# Altium footprint library Power_Lib_Altium.PcbLib: 383 footprints (part 13 of 24)
Each footprint in its own frame and in the unit in brackets; x right, y up, seen from the top. Pads: shape width x height; smd on the part's side, far side on the other; paste and mask are expansions set on the pad; w line width, h text height; cw(c..) or ccw(c..) is an arc to the next point about the centre after c.
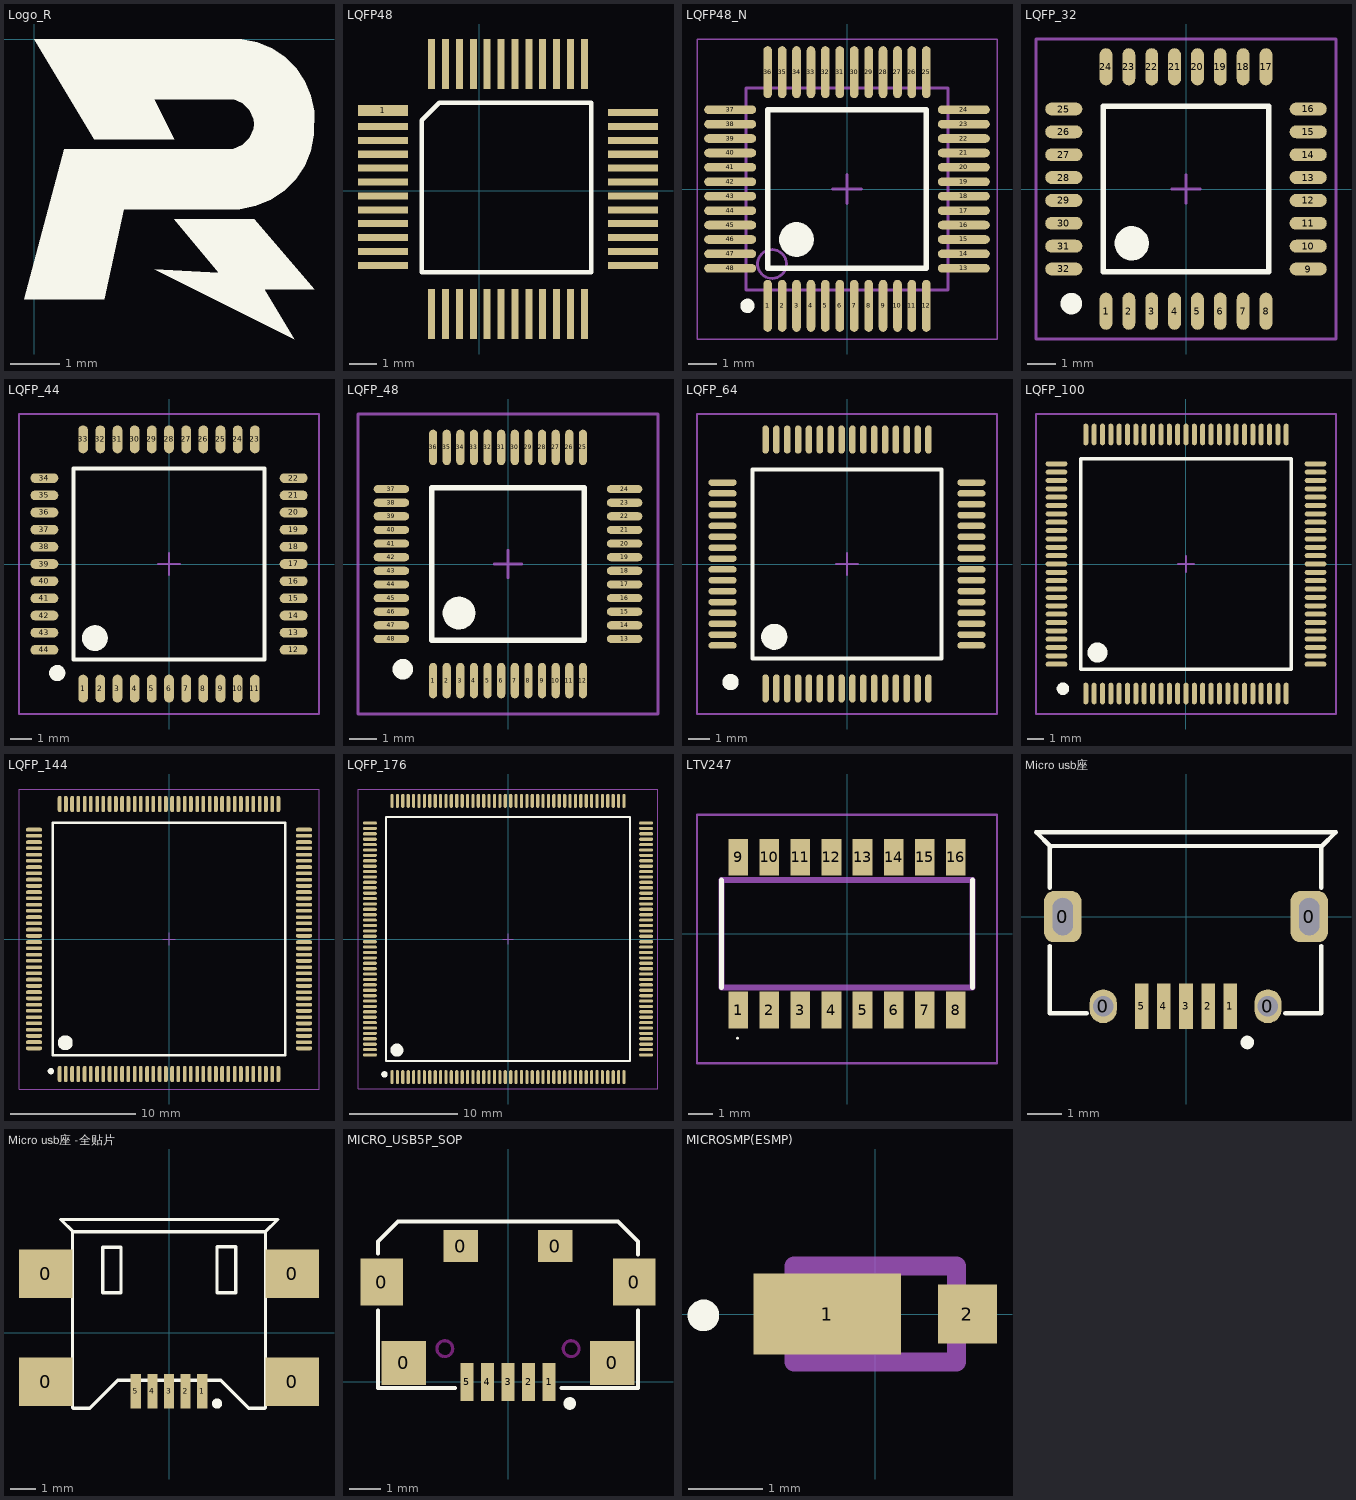
[diagram p12: the footprints below, top view; thin cyan lines are the x and y axes]

## Logo_R [mm]
Top Overlay:
  region: 5.69,-5.08 4.674,-5.08 5.283,-6.096 2.438,-4.674 3.75,-4.75 2.845,-3.658 4.47,-3.658
  region: 4.538,-0.062 4.834,-0.185 5.1,-0.363 5.327,-0.589 5.505,-0.856 5.627,-1.151 5.69,-1.465 5.69,-1.626 5.69,-1.778 5.69,-1.943 5.625,-2.267 5.499,-2.572 5.315,-2.847 5.082,-3.08 4.807,-3.264 4.502,-3.39 4.178,-3.454 4.013,-3.454 1.829,-3.454 1.422,-5.283 -0.203,-5.283 0.61,-2.235 3.962,-2.235 4.061,-2.225 4.245,-2.15 4.385,-2.009 4.461,-1.826 4.47,-1.727 4.461,-1.628 4.385,-1.445 4.245,-1.305 4.062,-1.229 3.962,-1.219 2.438,-1.219 2.845,-2.032 1.219,-2.032 0,0 4.224,0

## Logo_W [mm]

## LQFP48 [mil]
pads (48):
  rect 70.87x15 smd: 1(-136.5,113.7)
  rect 70.87x10 smd: 2(-136.5,91.02) 3(-136.5,71.33) 4(-136.5,51.65) 5(-136.5,31.96) 6(-136.5,12.28) 7(-136.5,-7.41) 8(-136.5,-27.09) 9(-136.5,-46.78) 10(-136.5,-66.47) 11(-136.5,-86.15) 12(-136.5,-105.83) 25(217.83,-105.83) 26(217.83,-86.15) 27(217.83,-66.47) 28(217.83,-46.78) 29(217.83,-27.09) 30(217.83,-7.41) 31(217.83,12.28) 32(217.83,31.96) 33(217.83,51.65) 34(217.83,71.33) 35(217.83,91.02) 36(217.83,110.7)
  rect 10x70.87 smd: 13(-67.6,-174.73) 14(-47.92,-174.73) 15(-28.23,-174.73) 16(-8.55,-174.73) 17(11.14,-174.73) 18(30.82,-174.73) 19(50.51,-174.73) 20(70.19,-174.73) 21(89.88,-174.73) 22(109.56,-174.73) 23(129.25,-174.73) 24(148.93,-174.73) 37(148.93,179.6) 38(129.25,179.6) 39(109.56,179.6) 40(89.88,179.6) 41(70.19,179.6) 42(50.51,179.6) 43(30.82,179.6) 44(11.14,179.6) 45(-8.55,179.6) 46(-28.23,179.6) 47(-47.92,179.6) 48(-67.6,179.6)
Top Overlay:
  lines w6.5: -81.51,99.69 -81.38,-115.68 158.78,-115.68 158.78,124.48 -56.72,124.48 -81.51,99.69
3D body "User Library-LQFP48_Grid_0.5_LQFP_PIN_2.sldprt": height 38.39, standoff 0.03, extent 176.47,-111 235.53,-100.37
3D body "User Library-LQFP48_Grid_0.5_LQFP_PIN_2.sldprt": height 38.39, standoff 0.03, extent 176.47,-91 235.53,-80.37
3D body "User Library-LQFP48_Grid_0.5_LQFP_PIN_2.sldprt": height 38.39, standoff 0.03, extent 176.47,-71.63 235.53,-61
3D body "User Library-LQFP48_Grid_0.5_LQFP_PIN_2.sldprt": height 38.39, standoff 0.03, extent 176.47,-52 235.53,-41.37
3D body "User Library-LQFP48_Grid_0.5_LQFP_PIN_2.sldprt": height 38.39, standoff 0.03, extent 176.47,-32 235.53,-21.37
3D body "User Library-LQFP48_Grid_0.5_LQFP_PIN_2.sldprt": height 38.39, standoff 0.03, extent 176.47,-12.63 235.53,-2
3D body "User Library-LQFP48_Grid_0.5_LQFP_PIN_2.sldprt": height 38.39, standoff 0.03, extent 176.47,7 235.53,17.63
3D body "User Library-LQFP48_Grid_0.5_LQFP_PIN_2.sldprt": height 38.39, standoff 0.03, extent 176.47,27 235.53,37.63
3D body "User Library-LQFP48_Grid_0.5_LQFP_PIN_2.sldprt": height 38.39, standoff 0.03, extent 176.47,46.37 235.53,57
3D body "User Library-LQFP48_Grid_0.5_LQFP_PIN_2.sldprt": height 38.39, standoff 0.03, extent 176.47,66.37 235.53,77
3D body "User Library-LQFP48_Grid_0.5_LQFP_PIN_2.sldprt": height 38.39, standoff 0.03, extent 177,85.68 236.06,96.32
3D body "User Library-LQFP48_Grid_0.5_LQFP_PIN_2.sldprt": height 38.39, standoff 0.03, extent 176.47,106 235.53,116.63
3D body "User Library-LQFP48_Grid_0.5_LQFP_PIN_2.sldprt": height 38.39, standoff 0.03, extent 144,137.47 154.63,196.53
3D body "User Library-LQFP48_Grid_0.5_LQFP_PIN_2.sldprt": height 38.39, standoff 0.03, extent 124,137.47 134.63,196.53
3D body "User Library-LQFP48_Grid_0.5_LQFP_PIN_2.sldprt": height 38.39, standoff 0.03, extent 104,137.47 114.63,196.53
3D body "User Library-LQFP48_Grid_0.5_LQFP_PIN_2.sldprt": height 38.39, standoff 0.03, extent 84,137.47 94.63,196.53
3D body "User Library-LQFP48_Grid_0.5_LQFP_PIN_2.sldprt": height 38.39, standoff 0.03, extent 65.37,137.47 76,196.53
3D body "User Library-LQFP48_Grid_0.5_LQFP_PIN_2.sldprt": height 38.39, standoff 0.03, extent 45,137.47 55.63,196.53
3D body "User Library-LQFP48_Grid_0.5_LQFP_PIN_2.sldprt": height 38.39, standoff 0.03, extent 26,137.47 36.63,196.53
3D body "User Library-LQFP48_Grid_0.5_LQFP_PIN_2.sldprt": height 38.39, standoff 0.03, extent 6,137.47 16.63,196.53
3D body "User Library-LQFP48_Grid_0.5_LQFP_PIN_2.sldprt": height 38.39, standoff 0.03, extent -13.63,137.47 -3,196.53
3D body "User Library-LQFP48_Grid_0.5_LQFP_PIN_2.sldprt": height 38.39, standoff 0.03, extent -34,137.47 -23.37,196.53
3D body "User Library-LQFP48_Grid_0.5_LQFP_PIN_2.sldprt": height 38.39, standoff 0.03, extent -53.63,137.47 -43,196.53
3D body "User Library-LQFP48_Grid_0.5_LQFP_PIN_2.sldprt": height 38.39, standoff 0.03, extent -73,137.47 -62.37,196.53
3D body "User Library-LQFP48_Grid_0.5_LQFP48_Koerper_2.sldprt": height 62.99, standoff 5.91, extent -95.8,-135.59 179.8,140
3D body "User Library-LQFP48_Grid_0.5_LQFP_PIN_2.sldprt": height 38.39, standoff 0.03, extent -152.53,108.37 -93.47,119
3D body "User Library-LQFP48_Grid_0.5_LQFP_PIN_2.sldprt": height 38.39, standoff 0.03, extent -152.53,85.37 -93.47,96
3D body "User Library-LQFP48_Grid_0.5_LQFP_PIN_2.sldprt": height 38.39, standoff 0.03, extent -152.53,66 -93.47,76.63
3D body "User Library-LQFP48_Grid_0.5_LQFP_PIN_2.sldprt": height 38.39, standoff 0.03, extent -152.53,46.37 -93.47,57
3D body "User Library-LQFP48_Grid_0.5_LQFP_PIN_2.sldprt": height 38.39, standoff 0.03, extent -152.53,26.37 -93.47,37
3D body "User Library-LQFP48_Grid_0.5_LQFP_PIN_2.sldprt": height 38.39, standoff 0.03, extent -152.53,7.11 -93.47,17.74
3D body "User Library-LQFP48_Grid_0.5_LQFP_PIN_2.sldprt": height 38.39, standoff 0.03, extent -152.53,-12.63 -93.47,-2
3D body "User Library-LQFP48_Grid_0.5_LQFP_PIN_2.sldprt": height 38.39, standoff 0.03, extent -152.53,-32.63 -93.47,-22
3D body "User Library-LQFP48_Grid_0.5_LQFP_PIN_2.sldprt": height 38.39, standoff 0.03, extent -152.53,-52.63 -93.47,-42
3D body "User Library-LQFP48_Grid_0.5_LQFP_PIN_2.sldprt": height 38.39, standoff 0.03, extent -152.53,-71.63 -93.47,-61
3D body "User Library-LQFP48_Grid_0.5_LQFP_PIN_2.sldprt": height 38.39, standoff 0.03, extent -152.53,-91.63 -93.47,-81
3D body "User Library-LQFP48_Grid_0.5_LQFP_PIN_2.sldprt": height 38.39, standoff 0.03, extent -153,-111.32 -93.94,-100.68
3D body "User Library-LQFP48_Grid_0.5_LQFP_PIN_2.sldprt": height 38.39, standoff 0.03, extent -73,-192.53 -62.37,-133.47
3D body "User Library-LQFP48_Grid_0.5_LQFP_PIN_2.sldprt": height 38.39, standoff 0.03, extent -53,-192.53 -42.37,-133.47
3D body "User Library-LQFP48_Grid_0.5_LQFP_PIN_2.sldprt": height 38.39, standoff 0.03, extent -33,-192.53 -22.37,-133.47
3D body "User Library-LQFP48_Grid_0.5_LQFP_PIN_2.sldprt": height 38.39, standoff 0.03, extent -14,-192.53 -3.37,-133.47
3D body "User Library-LQFP48_Grid_0.5_LQFP_PIN_2.sldprt": height 38.39, standoff 0.03, extent 6,-192.53 16.63,-133.47
3D body "User Library-LQFP48_Grid_0.5_LQFP_PIN_2.sldprt": height 38.39, standoff 0.03, extent 26,-192.53 36.63,-133.47
3D body "User Library-LQFP48_Grid_0.5_LQFP_PIN_2.sldprt": height 38.39, standoff 0.03, extent 45,-192.53 55.63,-133.47
3D body "User Library-LQFP48_Grid_0.5_LQFP_PIN_2.sldprt": height 38.39, standoff 0.03, extent 65,-192.53 75.63,-133.47
3D body "User Library-LQFP48_Grid_0.5_LQFP_PIN_2.sldprt": height 38.39, standoff 0.03, extent 85,-192.53 95.63,-133.47
3D body "User Library-LQFP48_Grid_0.5_LQFP_PIN_2.sldprt": height 38.39, standoff 0.03, extent 104,-192.53 114.63,-133.47
3D body "User Library-LQFP48_Grid_0.5_LQFP_PIN_2.sldprt": height 38.39, standoff 0.03, extent 124,-192.53 134.63,-133.47
3D body "User Library-LQFP48_Grid_0.5_LQFP_PIN_2.sldprt": height 38.39, standoff 0.03, extent 144,-192.53 154.63,-133.47

## LQFP48_N [mm] "QFP, 48-Leads, Body 7x7mm, Pitch 0.5mm, IPC Medium Density"
height 1.6
pads (48):
  oval 0.3x1.8 smd: 1(-2.75,-4.05) 2(-2.25,-4.05) 3(-1.75,-4.05) 4(-1.25,-4.05) 5(-0.75,-4.05) 6(-0.25,-4.05) 7(0.25,-4.05) 8(0.75,-4.05) 9(1.25,-4.05) 10(1.75,-4.05) 11(2.25,-4.05) 12(2.75,-4.05) 25(2.75,4.05) 26(2.25,4.05) 27(1.75,4.05) 28(1.25,4.05) 29(0.75,4.05) 30(0.25,4.05) 31(-0.25,4.05) 32(-0.75,4.05) 33(-1.25,4.05) 34(-1.75,4.05) 35(-2.25,4.05) 36(-2.75,4.05)
  oval 1.8x0.3 smd: 13(4.05,-2.75) 14(4.05,-2.25) 15(4.05,-1.75) 16(4.05,-1.25) 17(4.05,-0.75) 18(4.05,-0.25) 19(4.05,0.25) 20(4.05,0.75) 21(4.05,1.25) 22(4.05,1.75) 23(4.05,2.25) 24(4.05,2.75) 37(-4.05,2.75) 38(-4.05,2.25) 39(-4.05,1.75) 40(-4.05,1.25) 41(-4.05,0.75) 42(-4.05,0.25) 43(-4.05,-0.25) 44(-4.05,-0.75) 45(-4.05,-1.25) 46(-4.05,-1.75) 47(-4.05,-2.25) 48(-4.05,-2.75)
Top Overlay:
  circle w0.25: c-3.45,-4.05 r0.125
  circle w0.6: c-1.75,-1.75 r0.3
  lines w0.2: -2.75,-2.75 2.75,-2.75 2.75,2.75 -2.75,2.75 -2.75,-2.75
Mechanical 13:
  circle w0.1: c-2.6,-2.6 r0.5
  lines w0.1: -3.5,-3.5 3.5,-3.5 3.5,3.5 -3.5,3.5 -3.5,-3.5
Mechanical 15:
  lines w0.05: -5.2,-5.2 5.2,-5.2 5.2,5.2 -5.2,5.2 -5.2,-5.2
  lines w0.1: -0.5,0 0.5,0 ; 0,-0.5 0,0.5
3D body: height 1.6, standoff 0.05, extent -3.5,-3.5 3.5,3.5

## LQFP_32 [mm]
height 1.2
pads (32):
  oval 0.45x1.3 smd: 1(-2.8,-4.277) 2(-2,-4.277) 3(-1.2,-4.277) 4(-0.4,-4.277) 5(0.4,-4.277) 6(1.2,-4.277) 7(2,-4.277) 8(2.8,-4.277) 17(2.8,4.277) 18(2,4.277) 19(1.2,4.277) 20(0.4,4.277) 21(-0.4,4.277) 22(-1.2,4.277) 23(-2,4.277) 24(-2.8,4.277)
  oval 1.3x0.45 smd: 9(4.277,-2.8) 10(4.277,-2) 11(4.277,-1.2) 12(4.277,-0.4) 13(4.277,0.4) 14(4.277,1.2) 15(4.277,2) 16(4.277,2.8) 25(-4.277,2.8) 26(-4.277,2) 27(-4.277,1.2) 28(-4.277,0.4) 29(-4.277,-0.4) 30(-4.277,-1.2) 31(-4.277,-2) 32(-4.277,-2.8)
Top Overlay:
  circle w0.6: c-1.9,-1.9 r0.3
  circle w0.5: c-4.013,-4.011 r0.125
  lines w0.2: -2.9,-2.9 -2.9,2.9 2.9,2.9 2.9,-2.9 -2.9,-2.9
Mechanical 15:
  lines w0.1: -0.5,0 0.5,0 ; 0,-0.5 0,0.5 ; -5.25,-5.25 -5.25,5.25 5.25,5.25 5.25,-5.25 -5.25,-5.25
3D body "LQFP_32.STEP": height 1.48, standoff -0.01, extent -4.552,-4.503 4.553,4.503

## LQFP_44 [mm]
height 1.6
pads (44):
  oval 0.45x1.3 smd: 1(-4,-5.804) 2(-3.2,-5.804) 3(-2.4,-5.804) 4(-1.6,-5.804) 5(-0.8,-5.804) 6(0,-5.804) 7(0.8,-5.804) 8(1.6,-5.804) 9(2.4,-5.804) 10(3.2,-5.804) 11(4,-5.804) 23(4,5.804) 24(3.2,5.804) 25(2.4,5.804) 26(1.6,5.804) 27(0.8,5.804) 28(0,5.804) 29(-0.8,5.804) 30(-1.6,5.804) 31(-2.4,5.804) 32(-3.2,5.804) 33(-4,5.804)
  oval 1.3x0.45 smd: 12(5.804,-4) 13(5.804,-3.2) 14(5.804,-2.4) 15(5.804,-1.6) 16(5.804,-0.8) 17(5.804,0) 18(5.804,0.8) 19(5.804,1.6) 20(5.804,2.4) 21(5.804,3.2) 22(5.804,4) 34(-5.804,4) 35(-5.804,3.2) 36(-5.804,2.4) 37(-5.804,1.6) 38(-5.804,0.8) 39(-5.804,0) 40(-5.804,-0.8) 41(-5.804,-1.6) 42(-5.804,-2.4) 43(-5.804,-3.2) 44(-5.804,-4)
Top Overlay:
  circle w0.5: c-5.205,-5.08 r0.125
  circle w0.6: c-3.45,-3.45 r0.3
  lines w0.2: -4.45,-4.45 4.45,-4.45 4.45,4.45 -4.45,4.45 -4.45,-4.45
Mechanical 15:
  lines w0.1: -0.5,0 0.5,0 ; 0,-0.5 0,0.5 ; -6.985,-6.985 6.985,-6.985 6.985,6.985 -6.985,6.985 -6.985,-6.985
3D body "LQFP_44.STEP": height 1.68, standoff -0.01, extent -5.999,-5.999 5.999,5.999

## LQFP_48 [mm]
height 1.6
pads (48):
  oval 0.3x1.3 smd: 1(-2.75,-4.28) 2(-2.25,-4.28) 3(-1.75,-4.28) 4(-1.25,-4.28) 5(-0.75,-4.28) 6(-0.25,-4.28) 7(0.25,-4.28) 8(0.75,-4.28) 9(1.25,-4.28) 10(1.75,-4.28) 11(2.25,-4.28) 12(2.75,-4.28) 25(2.75,4.28) 26(2.25,4.28) 27(1.75,4.28) 28(1.25,4.28) 29(0.75,4.28) 30(0.25,4.28) 31(-0.25,4.28) 32(-0.75,4.28) 33(-1.25,4.28) 34(-1.75,4.28) 35(-2.25,4.28) 36(-2.75,4.28)
  oval 1.3x0.3 smd: 13(4.28,-2.75) 14(4.28,-2.25) 15(4.28,-1.75) 16(4.28,-1.25) 17(4.28,-0.75) 18(4.28,-0.25) 19(4.28,0.25) 20(4.28,0.75) 21(4.28,1.25) 22(4.28,1.75) 23(4.28,2.25) 24(4.28,2.75) 37(-4.28,2.75) 38(-4.28,2.25) 39(-4.28,1.75) 40(-4.28,1.25) 41(-4.28,0.75) 42(-4.28,0.25) 43(-4.28,-0.25) 44(-4.28,-0.75) 45(-4.28,-1.25) 46(-4.28,-1.75) 47(-4.28,-2.25) 48(-4.28,-2.75)
Top Overlay:
  circle w0.6: c-1.8,-1.8 r0.3
  circle w0.5: c-3.859,-3.861 r0.125
  lines w0.2: -2.8,-2.8 -2.8,2.8 2.8,2.8 2.8,-2.8 -2.8,-2.8
Mechanical 15:
  lines w0.1: -0.5,0 0.5,0 ; 0,-0.5 0,0.5 ; -5.505,-5.505 -5.505,5.505 5.505,5.505 5.505,-5.505 -5.505,-5.505
3D body "LQFP_48.STEP": height 1.52, standoff -0.01, extent -4.499,-4.499 4.499,4.499

## LQFP_64 [mm]
height 1.6
pads (64):
  oval 0.3x1.3 smd: 1(-3.75,-5.729) 2(-3.25,-5.729) 3(-2.75,-5.729) 4(-2.25,-5.729) 5(-1.75,-5.729) 6(-1.25,-5.729) 7(-0.75,-5.729) 8(-0.25,-5.729) 9(0.25,-5.729) 10(0.75,-5.729) 11(1.25,-5.729) 12(1.75,-5.729) 13(2.25,-5.729) 14(2.75,-5.729) 15(3.25,-5.729) 16(3.75,-5.729) 33(3.75,5.729) 34(3.25,5.729) 35(2.75,5.729) 36(2.25,5.729) 37(1.75,5.729) 38(1.25,5.729) 39(0.75,5.729) 40(0.25,5.729) 41(-0.25,5.729) 42(-0.75,5.729) 43(-1.25,5.729) 44(-1.75,5.729) 45(-2.25,5.729) 46(-2.75,5.729) 47(-3.25,5.729) 48(-3.75,5.729)
  oval 1.3x0.3 smd: 17(5.729,-3.75) 18(5.729,-3.25) 19(5.729,-2.75) 20(5.729,-2.25) 21(5.729,-1.75) 22(5.729,-1.25) 23(5.729,-0.75) 24(5.729,-0.25) 25(5.729,0.25) 26(5.729,0.75) 27(5.729,1.25) 28(5.729,1.75) 29(5.729,2.25) 30(5.729,2.75) 31(5.729,3.25) 32(5.729,3.75) 49(-5.729,3.75) 50(-5.729,3.25) 51(-5.729,2.75) 52(-5.729,2.25) 53(-5.729,1.75) 54(-5.729,1.25) 55(-5.729,0.75) 56(-5.729,0.25) 57(-5.729,-0.25) 58(-5.729,-0.75) 59(-5.729,-1.25) 60(-5.729,-1.75) 61(-5.729,-2.25) 62(-5.729,-2.75) 63(-5.729,-3.25) 64(-5.729,-3.75)
Top Overlay:
  circle w0.6: c-3.35,-3.35 r0.3
  circle w0.5: c-5.357,-5.436 r0.125
  lines w0.2: -4.35,-4.35 -4.35,4.35 4.35,4.35 4.35,-4.35 -4.35,-4.35
Mechanical 15:
  lines w0.1: -0.5,0 0.5,0 ; 0,-0.5 0,0.5 ; -6.904,-6.904 -6.904,6.904 6.904,6.904 6.904,-6.904 -6.904,-6.904
3D body "LQFP_64.STEP": height 1.78, standoff -0.01, extent -5.999,-5.999 5.999,5.999

## LQFP_100 [mm]
height 1.6
pads (100):
  oval 0.3x1.3 smd: 1(-6,-7.754) 2(-5.5,-7.754) 3(-5,-7.754) 4(-4.5,-7.754) 5(-4,-7.754) 6(-3.5,-7.754) 7(-3,-7.754) 8(-2.5,-7.754) 9(-2,-7.754) 10(-1.5,-7.754) 11(-1,-7.754) 12(-0.5,-7.754) 13(0,-7.754) 14(0.5,-7.754) 15(1,-7.754) 16(1.5,-7.754) 17(2,-7.754) 18(2.5,-7.754) 19(3,-7.754) 20(3.5,-7.754) 21(4,-7.754) 22(4.5,-7.754) 23(5,-7.754) 24(5.5,-7.754) 25(6,-7.754) 51(6,7.754) 52(5.5,7.754) 53(5,7.754) 54(4.5,7.754) 55(4,7.754) 56(3.5,7.754) 57(3,7.754) 58(2.5,7.754) 59(2,7.754) 60(1.5,7.754) 61(1,7.754) 62(0.5,7.754) 63(0,7.754) 64(-0.5,7.754) 65(-1,7.754) 66(-1.5,7.754) 67(-2,7.754) 68(-2.5,7.754) 69(-3,7.754) 70(-3.5,7.754) 71(-4,7.754) 72(-4.5,7.754) 73(-5,7.754) 74(-5.5,7.754) 75(-6,7.754)
  oval 1.3x0.3 smd: 26(7.754,-6) 27(7.754,-5.5) 28(7.754,-5) 29(7.754,-4.5) 30(7.754,-4) 31(7.754,-3.5) 32(7.754,-3) 33(7.754,-2.5) 34(7.754,-2) 35(7.754,-1.5) 36(7.754,-1) 37(7.754,-0.5) 38(7.754,0) 39(7.754,0.5) 40(7.754,1) 41(7.754,1.5) 42(7.754,2) 43(7.754,2.5) 44(7.754,3) 45(7.754,3.5) 46(7.754,4) 47(7.754,4.5) 48(7.754,5) 49(7.754,5.5) 50(7.754,6) 76(-7.754,6) 77(-7.754,5.5) 78(-7.754,5) 79(-7.754,4.5) 80(-7.754,4) 81(-7.754,3.5) 82(-7.754,3) 83(-7.754,2.5) 84(-7.754,2) 85(-7.754,1.5) 86(-7.754,1) 87(-7.754,0.5) 88(-7.754,0) 89(-7.754,-0.5) 90(-7.754,-1) 91(-7.754,-1.5) 92(-7.754,-2) 93(-7.754,-2.5) 94(-7.754,-3) 95(-7.754,-3.5) 96(-7.754,-4) 97(-7.754,-4.5) 98(-7.754,-5) 99(-7.754,-5.5) 100(-7.754,-6)
Top Overlay:
  circle w0.6: c-5.3,-5.3 r0.3
  circle w0.5: c-7.364,-7.468 r0.125
  lines w0.2: -6.3,-6.3 -6.3,6.3 6.3,6.3 6.3,-6.3 -6.3,-6.3
Mechanical 15:
  lines w0.1: -0.5,0 0.5,0 ; 0,-0.5 0,0.5 ; -8.979,-8.979 -8.979,8.979 8.979,8.979 8.979,-8.979 -8.979,-8.979
3D body "LQFP_100.STEP": height 1.72, standoff -0.03, extent -7.998,-7.999 7.999,7.999

## LQFP_144 [mm]
height 1.6
pads (144):
  oval 0.3x1.3 smd: 1(-8.75,-10.8) 2(-8.25,-10.8) 3(-7.75,-10.8) 4(-7.25,-10.8) 5(-6.75,-10.8) 6(-6.25,-10.8) 7(-5.75,-10.8) 8(-5.25,-10.8) 9(-4.75,-10.8) 10(-4.25,-10.8) 11(-3.75,-10.8) 12(-3.25,-10.8) 13(-2.75,-10.8) 14(-2.25,-10.8) 15(-1.75,-10.8) 16(-1.25,-10.8) 17(-0.75,-10.8) 18(-0.25,-10.8) 19(0.25,-10.8) 20(0.75,-10.8) 21(1.25,-10.8) 22(1.75,-10.8) 23(2.25,-10.8) 24(2.75,-10.8) 25(3.25,-10.8) 26(3.75,-10.8) 27(4.25,-10.8) 28(4.75,-10.8) 29(5.25,-10.8) 30(5.75,-10.8) 31(6.25,-10.8) 32(6.75,-10.8) 33(7.25,-10.8) 34(7.75,-10.8) 35(8.25,-10.8) 36(8.75,-10.8) 73(8.75,10.8) 74(8.25,10.8) 75(7.75,10.8) 76(7.25,10.8) 77(6.75,10.8) 78(6.25,10.8) 79(5.75,10.8) 80(5.25,10.8) 81(4.75,10.8) 82(4.25,10.8) 83(3.75,10.8) 84(3.25,10.8) 85(2.75,10.8) 86(2.25,10.8) 87(1.75,10.8) 88(1.25,10.8) 89(0.75,10.8) 90(0.25,10.8) 91(-0.25,10.8) 92(-0.75,10.8) 93(-1.25,10.8) 94(-1.75,10.8) 95(-2.25,10.8) 96(-2.75,10.8) 97(-3.25,10.8) 98(-3.75,10.8) 99(-4.25,10.8) 100(-4.75,10.8) 101(-5.25,10.8) 102(-5.75,10.8) 103(-6.25,10.8) 104(-6.75,10.8) 105(-7.25,10.8) 106(-7.75,10.8) 107(-8.25,10.8) 108(-8.75,10.8)
  oval 1.3x0.3 smd: 37(10.8,-8.75) 38(10.8,-8.25) 39(10.8,-7.75) 40(10.8,-7.25) 41(10.8,-6.75) 42(10.8,-6.25) 43(10.8,-5.75) 44(10.8,-5.25) 45(10.8,-4.75) 46(10.8,-4.25) 47(10.8,-3.75) 48(10.8,-3.25) 49(10.8,-2.75) 50(10.8,-2.25) 51(10.8,-1.75) 52(10.8,-1.25) 53(10.8,-0.75) 54(10.8,-0.25) 55(10.8,0.25) 56(10.8,0.75) 57(10.8,1.25) 58(10.8,1.75) 59(10.8,2.25) 60(10.8,2.75) 61(10.8,3.25) 62(10.8,3.75) 63(10.8,4.25) 64(10.8,4.75) 65(10.8,5.25) 66(10.8,5.75) 67(10.8,6.25) 68(10.8,6.75) 69(10.8,7.25) 70(10.8,7.75) 71(10.8,8.25) 72(10.8,8.75) 109(-10.8,8.75) 110(-10.8,8.25) 111(-10.8,7.75) 112(-10.8,7.25) 113(-10.8,6.75) 114(-10.8,6.25) 115(-10.8,5.75) 116(-10.8,5.25) 117(-10.8,4.75) 118(-10.8,4.25) 119(-10.8,3.75) 120(-10.8,3.25) 121(-10.8,2.75) 122(-10.8,2.25) 123(-10.8,1.75) 124(-10.8,1.25) 125(-10.8,0.75) 126(-10.8,0.25) 127(-10.8,-0.25) 128(-10.8,-0.75) 129(-10.8,-1.25) 130(-10.8,-1.75) 131(-10.8,-2.25) 132(-10.8,-2.75) 133(-10.8,-3.25) 134(-10.8,-3.75) 135(-10.8,-4.25) 136(-10.8,-4.75) 137(-10.8,-5.25) 138(-10.8,-5.75) 139(-10.8,-6.25) 140(-10.8,-6.75) 141(-10.8,-7.25) 142(-10.8,-7.75) 143(-10.8,-8.25) 144(-10.8,-8.75)
Top Overlay:
  circle w0.6: c-8.3,-8.3 r0.3
  circle w0.25: c-9.45,-10.575 r0.13
  lines w0.2: -9.3,-9.3 -9.3,9.3 9.3,9.3 9.3,-9.3 -9.3,-9.3
Mechanical 15:
  lines w0.1: -0.5,0 0.5,0 ; 0,-0.5 0,0.5 ; -12,-12 12,-12 12,12 -12,12 -12,-12
3D body "LQFP_144.STEP": height 1.55, standoff 0, extent -11.003,-11.003 11.003,11.003

## LQFP_176 [mm]
height 1.6
pads (176):
  oval 0.3x1.3 smd: 1(-10.75,-12.804) 2(-10.25,-12.804) 3(-9.75,-12.804) 4(-9.25,-12.804) 5(-8.75,-12.804) 6(-8.25,-12.804) 7(-7.75,-12.804) 8(-7.25,-12.804) 9(-6.75,-12.804) 10(-6.25,-12.804) 11(-5.75,-12.804) 12(-5.25,-12.804) 13(-4.75,-12.804) 14(-4.25,-12.804) 15(-3.75,-12.804) 16(-3.25,-12.804) 17(-2.75,-12.804) 18(-2.25,-12.804) 19(-1.75,-12.804) 20(-1.25,-12.804) 21(-0.75,-12.804) 22(-0.25,-12.804) 23(0.25,-12.804) 24(0.75,-12.804) 25(1.25,-12.804) 26(1.75,-12.804) 27(2.25,-12.804) 28(2.75,-12.804) 29(3.25,-12.804) 30(3.75,-12.804) 31(4.25,-12.804) 32(4.75,-12.804) 33(5.25,-12.804) 34(5.75,-12.804) 35(6.25,-12.804) 36(6.75,-12.804) 37(7.25,-12.804) 38(7.75,-12.804) 39(8.25,-12.804) 40(8.75,-12.804) 41(9.25,-12.804) 42(9.75,-12.804) 43(10.25,-12.804) 44(10.75,-12.804) 89(10.75,12.804) 90(10.25,12.804) 91(9.75,12.804) 92(9.25,12.804) 93(8.75,12.804) 94(8.25,12.804) 95(7.75,12.804) 96(7.25,12.804) 97(6.75,12.804) 98(6.25,12.804) 99(5.75,12.804) 100(5.25,12.804) 101(4.75,12.804) 102(4.25,12.804) 103(3.75,12.804) 104(3.25,12.804) 105(2.75,12.804) 106(2.25,12.804) 107(1.75,12.804) 108(1.25,12.804) 109(0.75,12.804) 110(0.25,12.804) 111(-0.25,12.804) 112(-0.75,12.804) 113(-1.25,12.804) 114(-1.75,12.804) 115(-2.25,12.804) 116(-2.75,12.804) 117(-3.25,12.804) 118(-3.75,12.804) 119(-4.25,12.804) 120(-4.75,12.804) 121(-5.25,12.804) 122(-5.75,12.804) 123(-6.25,12.804) 124(-6.75,12.804) 125(-7.25,12.804) 126(-7.75,12.804) 127(-8.25,12.804) 128(-8.75,12.804) 129(-9.25,12.804) 130(-9.75,12.804) 131(-10.25,12.804) 132(-10.75,12.804)
  oval 1.3x0.3 smd: 45(12.804,-10.75) 46(12.804,-10.25) 47(12.804,-9.75) 48(12.804,-9.25) 49(12.804,-8.75) 50(12.804,-8.25) 51(12.804,-7.75) 52(12.804,-7.25) 53(12.804,-6.75) 54(12.804,-6.25) 55(12.804,-5.75) 56(12.804,-5.25) 57(12.804,-4.75) 58(12.804,-4.25) 59(12.804,-3.75) 60(12.804,-3.25) 61(12.804,-2.75) 62(12.804,-2.25) 63(12.804,-1.75) 64(12.804,-1.25) 65(12.804,-0.75) 66(12.804,-0.25) 67(12.804,0.25) 68(12.804,0.75) 69(12.804,1.25) 70(12.804,1.75) 71(12.804,2.25) 72(12.804,2.75) 73(12.804,3.25) 74(12.804,3.75) 75(12.804,4.25) 76(12.804,4.75) 77(12.804,5.25) 78(12.804,5.75) 79(12.804,6.25) 80(12.804,6.75) 81(12.804,7.25) 82(12.804,7.75) 83(12.804,8.25) 84(12.804,8.75) 85(12.804,9.25) 86(12.804,9.75) 87(12.804,10.25) 88(12.804,10.75) 133(-12.804,10.75) 134(-12.804,10.25) 135(-12.804,9.75) 136(-12.804,9.25) 137(-12.804,8.75) 138(-12.804,8.25) 139(-12.804,7.75) 140(-12.804,7.25) 141(-12.804,6.75) 142(-12.804,6.25) 143(-12.804,5.75) 144(-12.804,5.25) 145(-12.804,4.75) 146(-12.804,4.25) 147(-12.804,3.75) 148(-12.804,3.25) 149(-12.804,2.75) 150(-12.804,2.25) 151(-12.804,1.75) 152(-12.804,1.25) 153(-12.804,0.75) 154(-12.804,0.25) 155(-12.804,-0.25) 156(-12.804,-0.75) 157(-12.804,-1.25) 158(-12.804,-1.75) 159(-12.804,-2.25) 160(-12.804,-2.75) 161(-12.804,-3.25) 162(-12.804,-3.75) 163(-12.804,-4.25) 164(-12.804,-4.75) 165(-12.804,-5.25) 166(-12.804,-5.75) 167(-12.804,-6.25) 168(-12.804,-6.75) 169(-12.804,-7.25) 170(-12.804,-7.75) 171(-12.804,-8.25) 172(-12.804,-8.75) 173(-12.804,-9.25) 174(-12.804,-9.75) 175(-12.804,-10.25) 176(-12.804,-10.75)
Top Overlay:
  circle w0.3: c-11.45,-12.55 r0.15
  circle w0.6: c-10.3,-10.3 r0.3
  lines w0.2: -11.3,-11.3 11.3,-11.3 11.3,11.3 -11.3,11.3 -11.3,-11.3
Mechanical 15:
  lines w0.1: -0.5,0 0.5,0 ; 0,-0.5 0,0.5 ; -13.904,-13.904 -13.904,13.904 13.904,13.904 13.904,-13.904 -13.904,-13.904
3D body "LQFP_176.STEP": height 1.5, standoff 0, extent -13.002,-13.002 13.003,13.003

## LTV247 [mm]
pads (16):
  rect 0.8x1.5 smd: 1(-4.445,-3.125) 2(-3.175,-3.125) 3(-1.905,-3.125) 4(-0.635,-3.125) 5(0.635,-3.125) 6(1.905,-3.125) 7(3.175,-3.125) 8(4.445,-3.125) 9(-4.445,3.125) 10(-3.175,3.125) 11(-1.905,3.125) 12(-0.635,3.125) 13(0.635,3.125) 14(1.905,3.125) 15(3.175,3.125) 16(4.445,3.125)
Top Overlay:
  lines w0.061: -4.507,-4.278 cw(c-4.477,-4.278) -4.447,-4.278 cw(c-4.477,-4.278) -4.507,-4.278
  lines w0.2: -5.14,-2.2 -5.14,2.2 ; 5.14,-2.2 5.14,2.2
Mechanical 13:
  lines w0.254: -5.14,-2.2 -5.14,2.2 5.14,2.2 5.14,-2.2 -5.14,-2.2
Mechanical 15:
  lines w0.1: -6.14,-5.308 -6.14,4.875 6.14,4.875 6.14,-5.308 -6.14,-5.308
3D body "AQS221FR2S.stp": height 2.2, standoff 0, extent -5.185,-3.4 5.185,3.4

## Micro usb座 [mm] "Micro usb座 5pin"
pads (9):
  rrect50% 1.1x1.5 hole 0.6 slot 1.1 at 90 deg: 0(-3.632,0) 0(3.632,0)
  oval 0.8x1 hole 0.6: 0(-2.438,-2.642) 0(2.413,-2.642)
  rect 0.4x1.35 smd: 1(1.3,-2.642) 2(0.65,-2.642) 3(0,-2.642) 4(-0.65,-2.642) 5(-1.3,-2.642)
Top Overlay:
  circle w0.2: c1.805,-3.708 r0.1
  lines w0.127: -4.013,-0.864 -4.013,-2.845 -2.921,-2.845 ; -4.013,0.851 -4.013,2.083 -2.438,2.083 ; -3.988,2.057 -4.42,2.489 4.42,2.489 3.988,2.057 ; -3.988,2.083 3.988,2.083 3.988,0.851 ; 2.921,-2.845 3.988,-2.845 3.988,-0.864

## Micro usb座 -全贴片 [mm]
pads (9):
  rect 2.1x1.9 smd: 0(-4.826,-1.918) 0(-4.826,2.299) 0(4.826,-1.918) 0(4.826,2.299)
  rect 0.4x1.35 smd: 1(1.3,-2.299) 2(0.65,-2.299) 3(0,-2.299) 4(-0.65,-2.299) 5(-1.3,-2.299)
Top Overlay:
  circle w0.2: c1.881,-2.781 r0.1
  lines w0.127: -3.759,3.95 -4.242,4.432 4.267,4.432 3.759,3.924 ; -3.785,-2.934 -3.759,-2.959 -3.124,-2.959 -3.099,-2.959 -2.007,-1.867 2.032,-1.867 3.124,-2.959 3.759,-2.959 3.785,-2.934 3.785,3.95 -3.785,3.95 -3.785,-2.934 ; -2.591,1.562 -2.591,3.34 -1.88,3.34 -1.88,1.562 -2.591,1.562 ; 1.88,1.562 2.616,1.562 2.616,3.365 1.88,3.365 1.88,1.562
3D body "zx62m-b-5p_30_.stp": height 2.74, standoff -0.34, extent -5.737,-4.5 5.763,4.795

## MICRO_USB5P_SOP [mm]
pads (11):
  rect 1.35x1.5 smd: 0(-4,3.16) 0(4,3.16)
  rect 1.4x1.4 smd: 0(-3.3,0.6) 0(3.3,0.6)
  rect 1.1x1 smd: 0(-1.5,4.3) 0(1.5,4.3)
  rect 0.4x1.2 smd: 1(1.3,0) 2(0.65,0) 3(0,0) 4(-0.65,0) 5(-1.3,0)
Top Overlay:
  circle w0.2: c1.957,-0.686 r0.1
  lines w0.127: -4.115,2.261 -4.115,-0.203 -1.676,-0.203 ; -4.115,4.064 -4.115,4.445 -3.48,5.08 3.48,5.08 4.115,4.445 4.115,4.039 ; 1.702,-0.203 4.115,-0.203 4.115,2.261
Keep-Out Layer:
  circle w0.1: c2,1.05 r0.25
  circle w0.1: c-2,1.05 r0.25

## MICROSMP(ESMP) [mm]
pads (2):
  rect 2x1.1 smd: 1(-0.65,0)
  rect 0.8x0.8 smd: 2(1.25,0)
Top Overlay:
  circle w0.254: c-2.326,-0.019 r0.087
Mechanical 13:
  lines w0.254: -1.1,-0.65 -1.1,0.65 1.1,0.65 1.1,-0.65 -1.1,-0.65